# Altium footprint library MyPcbLib.PcbLib: 657 footprints (part 2 of 42)
Each footprint in its own frame and in the unit in brackets; x right, y up, seen from the top. Pads: shape width x height; smd on the part's side, far side on the other; paste and mask are expansions set on the pad; w line width, h text height; cw(c..) or ccw(c..) is an arc to the next point about the centre after c.
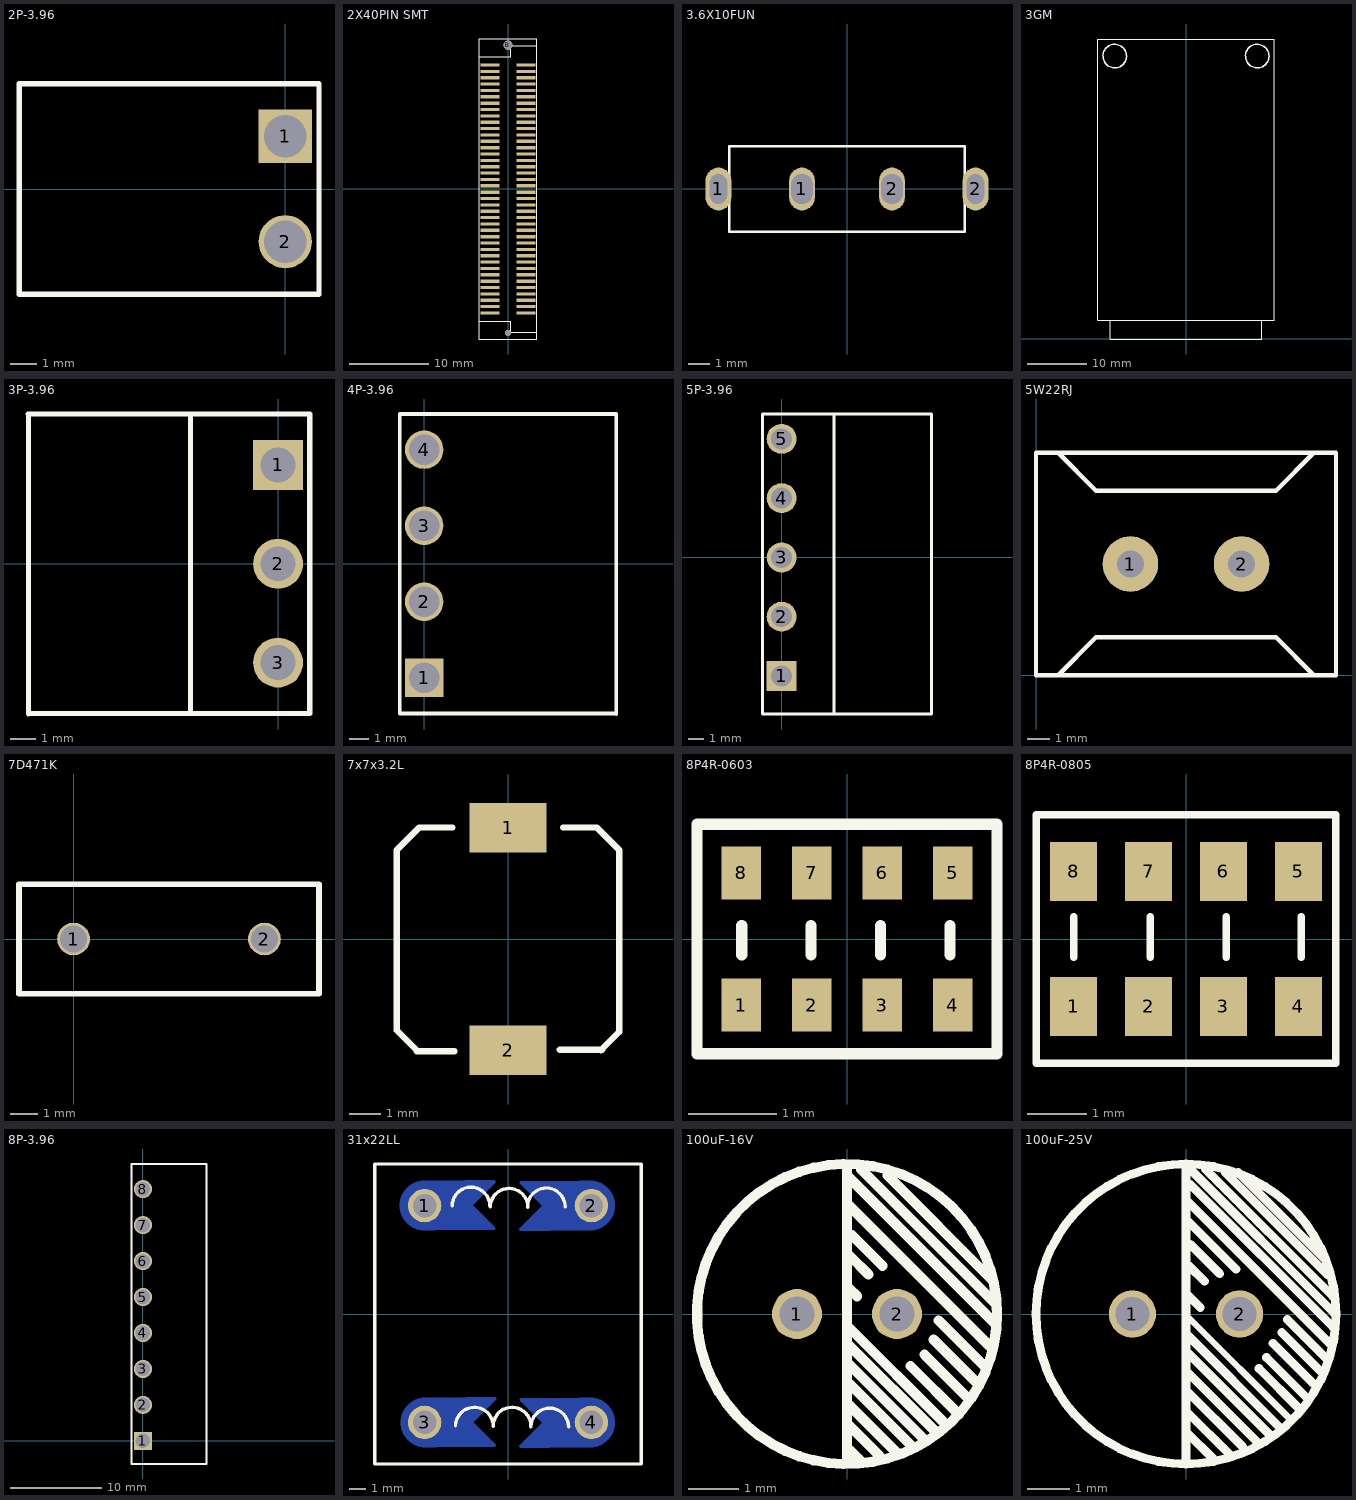
[diagram p1: the footprints below, top view; thin cyan lines are the x and y axes]

## 2P-3.96 [mm]
pads (2):
  rect 2x2 hole 1.6: 1(0,1.98)
  round 2 hole 1.6: 2(0,-1.98)
Top Overlay:
  lines w0.203: -10.008,3.96 1.27,3.96 1.27,-3.96 -9.957,-3.96 ; -10,-3.96 -10,3.96
3D body: height 0, standoff -9, extent -9.547,-4.039 0.453,3.881

## 2X40PIN SMT [mm]
pads (82):
  rect 2.4x0.4 smd: 1(-2.269,-15.608) 2(2.261,-15.608) 3(-2.269,-14.808) 4(2.261,-14.808) 5(-2.269,-14.008) 6(2.261,-14.008) 7(-2.269,-13.208) 8(2.261,-13.208) 9(-2.269,-12.408) 10(2.261,-12.408) 11(-2.269,-11.608) 12(2.261,-11.608) 13(-2.269,-10.808) 14(2.261,-10.808) 15(-2.269,-10.008) 16(2.261,-10.008) 17(-2.269,-9.208) 18(2.261,-9.208) 19(-2.269,-8.408) 20(2.261,-8.408) 21(-2.269,-7.608) 22(2.261,-7.608) 23(-2.269,-6.808) 24(2.261,-6.808) 25(-2.269,-6.008) 26(2.261,-6.008) 27(-2.269,-5.208) 28(2.261,-5.208) 29(-2.269,-4.408) 30(2.261,-4.408) 31(-2.269,-3.608) 32(2.261,-3.608) 33(-2.269,-2.808) 34(2.261,-2.808) 35(-2.269,-2.008) 36(2.261,-2.008) 37(-2.269,-1.208) 38(2.261,-1.208) 39(-2.269,-0.408) 40(2.261,-0.408) 41(-2.269,0.392) 42(2.261,0.392) 43(-2.269,1.192) 44(2.261,1.192) 45(-2.269,1.992) 46(2.261,1.992) 47(-2.269,2.792) 48(2.261,2.792) 49(-2.269,3.592) 50(2.261,3.592) 51(-2.269,4.392) 52(2.261,4.392) 53(-2.269,5.192) 54(2.261,5.192) 55(-2.269,5.992) 56(2.261,5.992) 57(-2.269,6.792) 58(2.261,6.792) 59(-2.269,7.592) 60(2.261,7.592) 61(-2.269,8.392) 62(2.261,8.392) 63(-2.269,9.192) 64(2.261,9.192) 65(-2.269,9.992) 66(2.261,9.992) 67(-2.269,10.792) 68(2.261,10.792) 69(-2.269,11.592) 70(2.261,11.592) 71(-2.269,12.392) 72(2.261,12.392) 73(-2.269,13.192) 74(2.261,13.192) 75(-2.269,13.992) 76(2.261,13.992) 77(-2.269,14.792) 78(2.261,14.792) 79(-2.269,15.592) 80(2.261,15.592)
  round 0.75 hole 0.75: A(-0.004,-18.108)
  round 1.12 hole 1.12: B(-0.004,18.092)
Top Overlay:
  lines w0.127: -3.642,-16.66 -2.848,-16.658 0.34,-16.658 0.34,-18.003 0.353,-18.016 2.46,-18.016 3.642,-18.02 ; -3.642,16.64 -2.848,16.642 0.34,16.642 0.34,17.988 0.353,18.001 2.46,18.001 3.642,18
  lines w0.152: -3.642,-18.883 -3.642,15.942 -3.642,18.867 3.642,18.867 3.642,-18.883 -3.642,-18.883

## 3.6X10FUN [mm]
pads (4):
  oval 1.2x2 hole 0.8 slot 1.4 at 90 deg: 1(-6,0) 2(6,0)
  oval 1.2x2 hole 1 slot 1.4 at 90 deg: 1(-2.1,0) 2(2.1,0)
Top Overlay:
  lines w0.127: -5.5,-2 5.5,-2 5.5,2 -5.5,2 -5.5,-2
3D body: height 8.6, standoff -3, extent 1.829,-2.476 6.129,2.324
3D body: height 8.6, standoff -3, extent -6.23,-2.375 -1.93,2.425

## 3GM [mm]
Top Overlay:
  lines w0.152: -12.906,3.167 -12.906,-0.005 12.894,-0.005 12.894,3.167 ; -15.006,3.195 14.994,3.195 14.994,50.945 -15.006,50.945 -15.006,3.195
  lines w0.254: -12.206,50.043 ccw(c-12.106,48.045) -12.143,50.045 ; 11.994,50.043 ccw(c12.094,48.045) 12.057,50.045

## 3P-3.96 [mm]
pads (3):
  rect 2x2 hole 1.4: 1(0,3.96)
  round 2 hole 1.4: 2(0,0) 3(0,-3.96)
Top Overlay:
  lines w0.203: -10.008,6 1.27,6 ; -10,-6.02 -10,6 ; -9.957,-6 1.27,-6 ; -3.508,-5.924 -3.508,6 ; 1.27,-5.994 1.27,5.969
3D body: height 7.2, standoff -1.6, extent -9.572,-5.969 0.428,6.031

## 4P-3.96 [mm]
pads (4):
  rect 2x2 hole 1.6: 1(0,-5.94)
  round 2 hole 1.6: 2(0,-1.98) 3(0,1.98) 4(0,5.94)
Top Overlay:
  lines w0.203: 10,-7.8 -1.27,-7.8 -1.27,7.8 10,7.8 ; 10.008,-7.828 10.008,7.772
3D body: height 0.5, standoff -9, extent -0.559,-8.376 9.441,8.224

## 5P-3.96 [mm]
pads (5):
  rect 2x2 hole 1.4: 1(0,-7.92)
  round 2 hole 1.4: 2(0,-3.96) 3(0,0) 4(0,3.96) 5(0,7.92)
Top Overlay:
  lines w0.203: 3.5,-10.333 3.5,9.58 ; 9.931,9.58 -1.27,9.58 -1.27,-10.46 9.957,-10.46 ; 10,-10.46 10,9.58
3D body: height 7.2, standoff -2.3, extent -0.479,-10.117 9.521,9.703

## 5W22RJ [mm]
pads (2):
  round 2.5 hole 1.2: 1(4.25,5) 2(9.25,5)
Top Overlay:
  lines w0.2: 1,0 2.7,1.7 10.8,1.7 12.5,0 ; 1,10 2.7,8.3 10.8,8.3 12.5,10 ; 0,0 0,10 13.5,10 13.5,0 0,0

## 7D471K [mm]
pads (2):
  round 1.2 hole 1: 1(0,0) 2(7,0)
Top Overlay:
  lines w0.203: -2,-2 9,-2 9,2 -2,2 -2,-2

## 7x7x3.2L [mm] "4R7 4.7uH 贴片电感 7mm*7mm*3.2mm"
pads (2):
  rect 2.5x1.6 smd: 1(0,3.6) 2(0,-3.6)
Top Overlay:
  lines w0.203: -2.953,-3.6 -3.6,-2.953 -3.6,2.877 -2.877,3.6 ; -2.946,-3.632 -1.727,-3.632 ; -2.87,3.607 -1.803,3.607 ; 1.676,-3.581 3.048,-3.581 ; 1.778,3.607 2.87,3.607 ; 2.877,3.6 3.6,2.877 3.6,-3.004 3.004,-3.6

## 8P4R-0603 [mm] "0603x4 4D03"
pads (8):
  rect 0.45x0.6 smd: 1(-1.2,-0.75) 2(-0.4,-0.75) 3(0.4,-0.75) 4(1.2,-0.75) 5(1.2,0.75) 6(0.4,0.75) 7(-0.4,0.75) 8(-1.2,0.75)
Top Overlay:
  lines w0.127: -1.194,-0.178 -1.194,0.152 ; -0.406,-0.178 -0.406,0.152 ; 0.381,-0.178 0.381,0.152 ; 1.168,-0.178 1.168,0.152 ; -1.7,-1.3 1.7,-1.3 1.7,1.3 -1.7,1.3 -1.7,-1.3

## 8P4R-0805 [mm]
pads (8):
  rect 0.8x1 smd: 1(-1.905,-1.143) 2(-0.635,-1.143) 3(0.635,-1.143) 4(1.905,-1.143) 5(1.905,1.143) 6(0.635,1.143) 7(-0.635,1.143) 8(-1.905,1.143)
Top Overlay:
  lines w0.127: -1.905,-0.305 -1.905,0.381 ; -0.61,-0.305 -0.61,0.381 ; 0.686,-0.305 0.686,0.381 ; 1.956,-0.305 1.956,0.381 ; -2.54,-2.1 2.54,-2.1 2.54,2.1 -2.54,2.1 -2.54,-2.1
3D body: height 0.9, standoff 0, extent -2.555,-0.924 -1.305,1.076
3D body: height 0.9, standoff 0, extent -1.285,-0.924 -0.035,1.076
3D body: height 0.9, standoff 0, extent -0.015,-0.924 1.235,1.076
3D body: height 0.9, standoff 0, extent 1.255,-0.924 2.505,1.076

## 8P-3.96 [mm]
pads (8):
  rect 2x2 hole 1.6: 1(0,0)
  round 2 hole 1.6: 2(0,3.96) 3(0,7.92) 4(0,11.88) 5(0,15.84) 6(0,19.8) 7(0,23.76) 8(0,27.72)
Top Overlay:
  lines w0.203: -1.27,-2.54 7,-2.54 7,30.48 -1.27,30.48 -1.27,-2.54
3D body: height 7.2, standoff -2.3, extent -0.356,-1.882 9.644,29.618

## 31x22LL [mm]
pads (4):
  round 2 / inner round 2 / far side round 2.5 hole 1.4: 1(-5,6.5) 2(5,6.5) 3(-5,-6.5) 4(5,-6.5)
Bottom Layer:
  rectangle: -5.004,-7.976 -2.438,-5.004
  region: 4.978,-5.029 2.413,-5.029 2.413,-8.001 4.978,-8.001
  region: 4.978,7.976 2.413,7.976 2.413,5.004 4.978,5.004
  rectangle: -5.055,5.029 -2.489,8.001
  lines w0.203: -3.15,7.417 -0.864,5.131 -2.616,5.131 ; -3.099,-5.588 -0.813,-7.874 -2.565,-7.874 ; -2.997,5.766 -0.838,7.925 -2.54,7.925 ; -2.946,-7.239 -0.787,-5.08 -2.489,-5.08 ; -2.616,7.315 -1.651,7.315 ; -2.591,7.772 -1.118,7.772 ; -2.565,-5.69 -1.6,-5.69 ; -2.565,5.918 -1.702,5.918 ; -2.565,7.442 -1.422,7.442 ; -2.54,-5.232 -1.067,-5.232 ; -2.54,6.02 -1.854,6.02 ; -2.54,7.62 -1.245,7.62 ; -2.515,-7.087 -1.651,-7.087 ; -2.515,-5.563 -1.372,-5.563 ; -2.515,5.613 -1.397,5.613 ; -2.489,-6.985 -1.803,-6.985 ; -2.489,-5.385 -1.194,-5.385 ; -2.489,5.766 -1.575,5.766 ; -2.464,-7.391 -1.346,-7.391 ; -2.438,-7.239 -1.524,-7.239 ; -2.438,5.461 -1.245,5.461 ; -2.413,5.182 -2.413,7.493 ; -2.388,-7.544 -1.194,-7.544 ; -2.362,-7.823 -2.362,-5.512 ; -2.337,6.807 -2.007,6.807 ; -2.286,-6.198 -1.956,-6.198 ; -2.261,7.137 -1.626,7.137 ; -2.235,5.182 -2.235,7.544 ; -2.21,-5.867 -1.575,-5.867 ; -2.21,6.96 -1.829,6.96 ; -2.184,-7.823 -2.184,-5.461 ; -2.159,-6.045 -1.778,-6.045 ; -2.108,5.207 -2.108,6.274 ; -2.083,5.309 -1.143,5.309 ; -2.057,-7.798 -2.057,-6.731 ; -2.032,-7.696 -1.092,-7.696 ; 1.041,-7.772 2.515,-7.772 ; 1.041,5.232 2.515,5.232 ; 1.067,-5.309 2.007,-5.309 ; 1.067,7.696 2.007,7.696 ; 1.168,-7.62 2.464,-7.62 ; 1.168,-5.461 2.362,-5.461 ; 1.168,5.385 2.464,5.385 ; 1.168,7.544 2.362,7.544 ; 1.321,-5.613 2.438,-5.613 ; 1.321,7.391 2.438,7.391 ; 1.346,-7.442 2.489,-7.442 ; 1.346,5.563 2.489,5.563 ; 1.499,-5.766 2.413,-5.766 ; 1.499,7.239 2.413,7.239 ; 1.549,-7.137 2.184,-7.137 ; 1.549,5.867 2.184,5.867 ; 1.575,-7.315 2.54,-7.315 ; 1.575,5.69 2.54,5.69 ; 1.626,-5.918 2.489,-5.918 ; 1.626,7.087 2.489,7.087 ; 1.753,-6.96 2.134,-6.96 ; 1.753,6.045 2.134,6.045 ; 1.778,-6.02 2.464,-6.02 ; 1.778,6.985 2.464,6.985 ; 1.93,-6.807 2.261,-6.807 ; 1.93,6.198 2.261,6.198 ; 2.032,-6.274 2.032,-5.207 ; 2.032,6.731 2.032,7.798 ; 2.159,-7.544 2.159,-5.182 ; 2.159,5.461 2.159,7.823 ; 2.337,-7.493 2.337,-5.182 ; 2.337,5.512 2.337,7.823 ; 2.464,-7.925 0.762,-7.925 2.921,-5.766 ; 2.464,5.08 0.762,5.08 2.921,7.239 ; 2.54,-5.131 0.787,-5.131 3.073,-7.417 ; 2.54,7.874 0.787,7.874 3.073,5.588
  lines w3: -5,6.505 -4.547,6.505 ; -4.949,-6.5 -4.496,-6.5 ; 4.47,-6.505 4.924,-6.505 ; 4.47,6.5 4.924,6.5
Top Overlay:
  lines w0.203: -3.353,6.502 cw(c-2.221,6.479) -1.09,6.479 ; -3.15,-6.706 cw(c-2.018,-6.729) -0.887,-6.729 ; -1.067,6.426 cw(c0.065,6.403) 1.196,6.403 ; -0.889,-6.706 cw(c0.242,-6.729) 1.374,-6.729 ; 1.168,6.452 cw(c2.3,6.428) 3.431,6.428 ; 1.372,-6.756 cw(c2.503,-6.78) 3.635,-6.78 ; -8,-9 8,-9 8,9 -8,9 -8,-9
Bottom Solder:
  rectangle: -5.105,-7.976 -1.956,-5.004
  region: 5.08,-5.029 1.93,-5.029 1.93,-8.001 5.08,-8.001
  region: 5.08,7.976 1.93,7.976 1.93,5.004 5.08,5.004
  rectangle: -5.156,5.029 -2.007,8.001
  lines w0.203: -4.089,7.899 -0.838,7.899 -2.108,6.629 -3.48,6.629 ; -4.064,5.156 -0.914,5.156 ; -4.039,-5.105 -0.787,-5.105 -2.057,-6.375 -3.429,-6.375 ; -4.013,-7.849 -0.864,-7.849 ; -3.454,6.579 -2.337,6.579 -0.889,5.131 -2.134,5.131 ; -3.404,-6.426 -2.286,-6.426 -0.838,-7.874 -2.083,-7.874 ; -2.667,5.537 -1.295,5.537 ; -2.667,7.747 -1.041,7.747 ; -2.642,5.893 -1.651,5.893 ; -2.642,6.883 -1.854,6.883 ; -2.616,-7.468 -1.245,-7.468 ; -2.616,-5.258 -0.991,-5.258 ; -2.616,7.595 -1.194,7.595 ; -2.591,-7.112 -1.6,-7.112 ; -2.591,-6.121 -1.803,-6.121 ; -2.591,5.69 -1.473,5.69 ; -2.591,6.045 -1.803,6.045 ; -2.565,-5.41 -1.143,-5.41 ; -2.54,-7.315 -1.422,-7.315 ; -2.54,-6.96 -1.753,-6.96 ; -2.54,7.417 -1.346,7.417 ; -2.515,5.283 -1.092,5.283 ; -2.515,5.41 -1.168,5.41 ; -2.515,7.036 -1.778,7.036 ; -2.489,-5.588 -1.295,-5.588 ; -2.464,-7.722 -1.041,-7.722 ; -2.464,-7.595 -1.118,-7.595 ; -2.464,-5.969 -1.727,-5.969 ; -2.388,7.214 -1.524,7.214 ; -2.337,-5.791 -1.473,-5.791 ; 0.838,-5.156 3.988,-5.156 ; 0.838,7.849 3.988,7.849 ; 0.965,-7.747 2.591,-7.747 ; 0.965,5.258 2.591,5.258 ; 1.016,-5.283 2.438,-5.283 ; 1.016,7.722 2.438,7.722 ; 1.092,-5.41 2.438,-5.41 ; 1.092,7.595 2.438,7.595 ; 1.118,-7.595 2.54,-7.595 ; 1.118,5.41 2.54,5.41 ; 1.219,-5.537 2.591,-5.537 ; 1.219,7.468 2.591,7.468 ; 1.27,-7.417 2.464,-7.417 ; 1.27,5.588 2.464,5.588 ; 1.397,-5.69 2.515,-5.69 ; 1.397,7.315 2.515,7.315 ; 1.448,-7.214 2.311,-7.214 ; 1.448,5.791 2.311,5.791 ; 1.575,-5.893 2.565,-5.893 ; 1.575,7.112 2.565,7.112 ; 1.702,-7.036 2.438,-7.036 ; 1.702,5.969 2.438,5.969 ; 1.727,-6.045 2.515,-6.045 ; 1.727,6.96 2.515,6.96 ; 1.778,-6.883 2.565,-6.883 ; 1.778,6.121 2.565,6.121 ; 2.057,-5.131 0.813,-5.131 2.261,-6.579 3.378,-6.579 ; 2.057,7.874 0.813,7.874 2.261,6.426 3.378,6.426 ; 3.404,-6.629 2.032,-6.629 0.762,-7.899 4.013,-7.899 ; 3.404,6.375 2.032,6.375 0.762,5.105 4.013,5.105

## 100uF-16V [mm]
pads (2):
  round 1 hole 0.7: 1(-1,0) 2(1,0)
Top Overlay:
  circle w0.203: c0,0 r3
  lines w0.203: 0,-2.946 0,2.972 ; 0.025,-1.803 1.016,-2.794 ; 0.025,-0.991 1.524,-2.489 ; 0.025,2.184 2.896,-0.686 ; 0.025,2.743 2.946,-0.178 ; 0.051,-2.718 0.305,-2.972 ; 0.051,-2.235 0.635,-2.819 ; 0.051,-1.397 1.27,-2.616 ; 0.051,-0.635 1.753,-2.337 ; 0.051,-0.279 1.905,-2.134 ; 0.051,0.508 0.203,0.356 ; 0.051,1.168 0.432,0.787 ; 0.102,1.575 0.711,0.965 ; 0.279,2.896 2.946,0.229 ; 0.813,2.769 2.87,0.711 ; 1.27,-1.041 2.235,-2.007 ; 1.549,-0.813 2.438,-1.702 ; 1.727,-0.508 2.616,-1.397 ; 1.829,-0.127 2.743,-1.041

## 100uF-25V [mm]
pads (2):
  round 1.1 hole 0.8: 1(-1.25,0) 2(1.25,0)
Top Overlay:
  circle w0.203: c0,0 r3.5
  lines w0.152: 0.051,-0.076 2.438,-2.464
  lines w0.203: 0,-3.48 0,3.48 ; 0.025,-2.769 0.635,-3.378 ; 0.025,-2.286 1.041,-3.302 ; 0.025,-1.803 1.321,-3.099 ; 0.025,-1.346 1.676,-2.997 ; 0.025,2.642 3.378,-0.711 ; 0.051,-0.914 1.956,-2.819 ; 0.051,-0.508 2.159,-2.616 ; 0.051,0.432 0.33,0.152 ; 0.051,2.159 1.168,1.041 ; 0.076,1.118 0.432,0.762 ; 0.076,3.404 3.454,0.025 ; 0.102,1.626 0.787,0.94 ; 0.102,3.023 3.429,-0.305 ; 0.457,3.378 3.429,0.406 ; 0.914,3.302 3.302,0.914 ; 1.219,3.302 3.226,1.295 ; 1.702,-1.27 2.642,-2.21 ; 1.88,-1.016 2.845,-1.981 ; 2.032,-0.686 3.023,-1.676 ; 2.235,-0.432 3.175,-1.372 ; 2.362,-0.127 3.302,-1.067